# Altium footprint library PcbLib.PcbLib: 12 footprints
Each footprint in its own frame and in the unit in brackets; x right, y up, seen from the top. Pads: shape width x height; smd on the part's side, far side on the other; paste and mask are expansions set on the pad; w line width, h text height; cw(c..) or ccw(c..) is an arc to the next point about the centre after c.
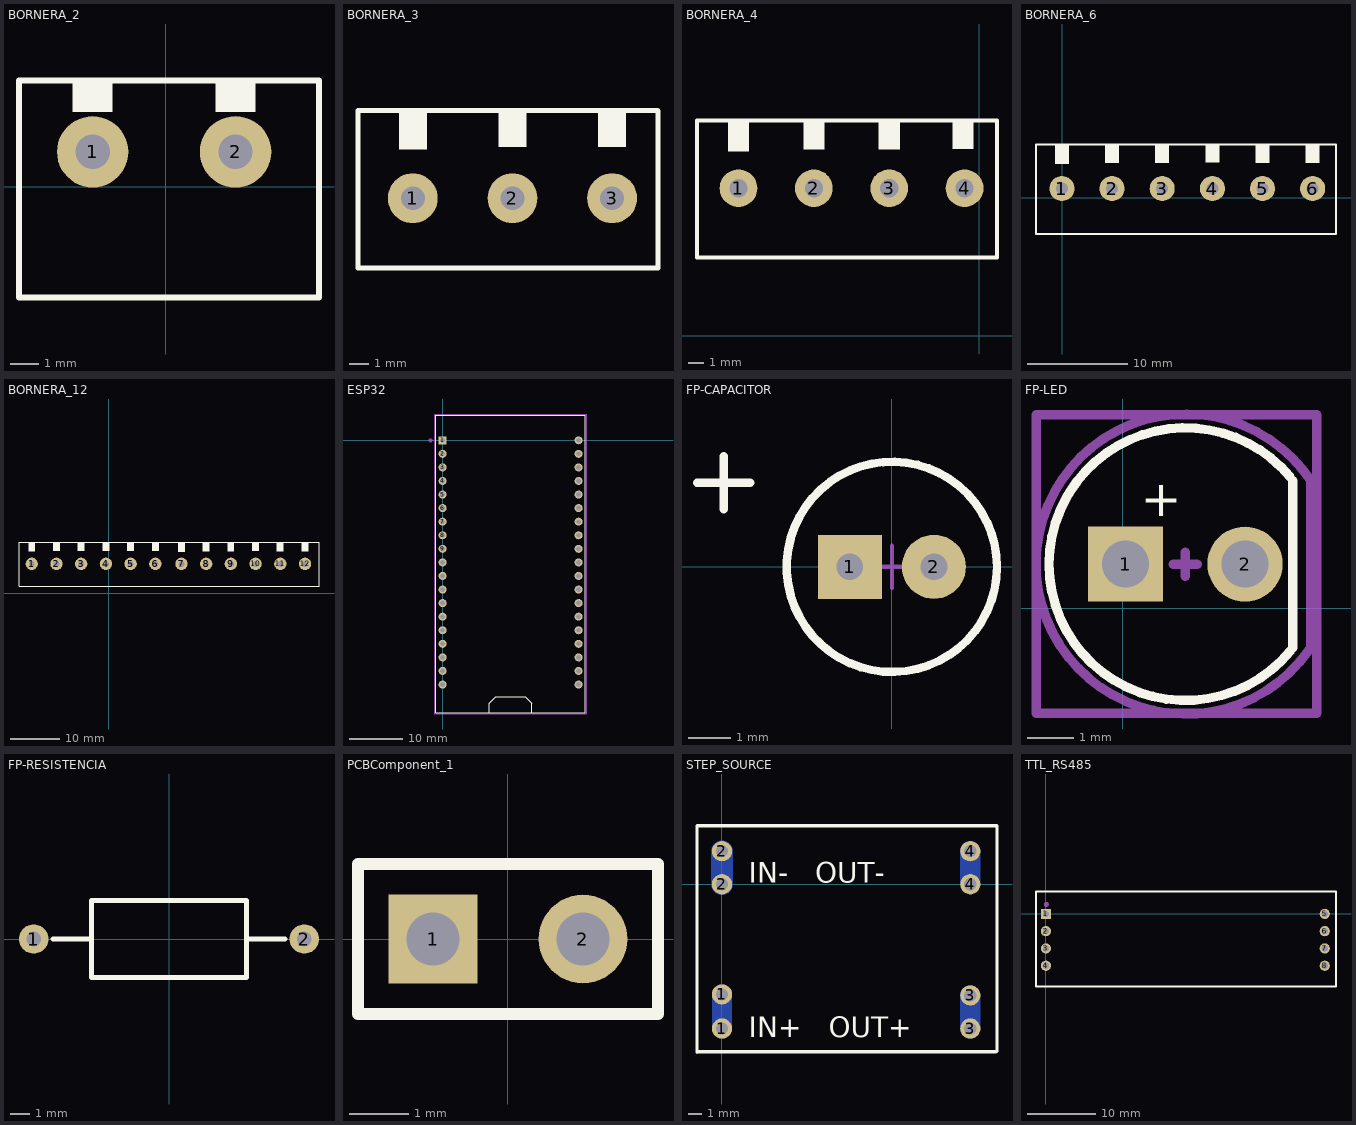
[diagram p0: the footprints below, top view; thin cyan lines are the x and y axes]

## BORNERA_2 [mm]
pads (2):
  round 2.5 hole 1.2: 1(-2.55,1.225) 2(2.45,1.225)
Top Overlay:
  rectangle: -3.25,2.625 -1.85,3.725
  rectangle: 1.75,2.625 3.15,3.725
  lines w0.2: -5.13,-3.875 -5.13,3.725 5.37,3.725 5.37,-3.875 -5.13,-3.875
3D body "User Library-bornera-1.STEP": height 10, standoff -3.75, extent -5.05,-3.795 5.45,3.805

## BORNERA_3 [mm]
pads (3):
  round 2.5 hole 1.2: 1(-15.975,9.8) 2(-10.975,9.8) 3(-5.975,9.8)
Top Overlay:
  rectangle: -16.675,12.25 -15.275,14.225
  rectangle: -6.675,12.375 -5.275,14.225
  rectangle: -11.675,12.375 -10.275,14.225
  lines w0.25: -18.725,6.3 -3.725,6.3 -3.675,6.3 -3.675,14.175 -3.7,14.2 -18.725,14.2 -18.725,6.3
3D body "bornera de 3 terminales.step": height 10, standoff -4, extent -18.65,6.25 -3.65,14.25

## BORNERA_4 [mm]
pads (4):
  round 2.5 hole 1.2: 1(-15.975,9.8) 2(-10.975,9.8) 3(-5.975,9.8) 4(-0.975,9.8)
Top Overlay:
  rectangle: -11.675,12.375 -10.275,14.225
  rectangle: -6.675,12.375 -5.275,14.225
  rectangle: -16.675,12.25 -15.275,14.225
  rectangle: -1.775,12.4 -0.375,14.25
  lines w0.25: -18.725,5.2 -18.725,14.3 1.175,14.3 1.175,5.2 -18.725,5.2
3D body "bornera de 4 terminales.step": height 12, standoff -3, extent -18.725,5.2 1.275,14.2

## BORNERA_6 [mm]
pads (6):
  round 2.5 hole 1.2: 1(-0.025,0.925) 2(4.975,0.925) 3(9.975,0.925) 4(14.975,0.925) 5(19.975,0.925) 6(24.975,0.925)
Top Overlay:
  rectangle: -0.725,3.375 0.675,5.35
  rectangle: 9.275,3.5 10.675,5.35
  rectangle: 14.275,3.525 15.675,5.35
  rectangle: 19.275,3.475 20.675,5.35
  rectangle: 24.275,3.5 25.675,5.35
  rectangle: 4.275,3.5 5.675,5.35
  lines w0.2: -2.605,-3.575 27.3,-3.575 27.3,5.325 -2.605,5.325 -2.605,-3.575
3D body "bornera de 6 terminales.STEP": height 12, standoff -3, extent -2.65,-3.625 27.35,5.375

## BORNERA_12 [mm]
pads (12):
  round 2.5 hole 1.2: 1(-15.55,6) 2(-10.55,6) 3(-5.55,6) 4(-0.55,6) 5(4.45,6) 6(9.45,6) 7(14.725,6) 8(19.725,6) 9(24.725,6) 10(29.725,6) 11(34.725,6) 12(39.725,6)
Top Overlay:
  rectangle: 14,8.4 15.4,10.375
  rectangle: 24,8.525 25.4,10.375
  rectangle: 29,8.55 30.4,10.375
  rectangle: 34,8.5 35.4,10.375
  rectangle: 39,8.525 40.4,10.375
  rectangle: 19,8.525 20.4,10.375
  rectangle: -16.25,8.45 -14.85,10.425
  rectangle: -6.25,8.575 -4.85,10.425
  rectangle: -1.25,8.6 0.15,10.425
  rectangle: 3.75,8.55 5.15,10.425
  rectangle: 8.75,8.575 10.15,10.425
  rectangle: -11.25,8.575 -9.85,10.425
  lines w0.2: -18.13,1.5 42.55,1.5 42.55,10.4 -18.13,10.4 -18.13,1.5
3D body "bornera de 12 terminales.STEP": height 12, standoff -3, extent -18.05,1.5 42.45,10.5

## ESP32 [mm]
pads (38):
  rect 1.5x1.5 hole 0.9: 1(0,0)
  round 1.5 hole 0.9: 2(0,-2.54) 3(0,-5.08) 4(0,-7.62) 5(0,-10.16) 6(0,-12.7) 7(0,-15.24) 8(0,-17.78) 9(0,-20.32) 10(0,-22.86) 11(0,-25.4) 12(0,-27.94) 13(0,-30.48) 14(0,-33.02) 15(0,-35.56) 16(0,-38.1) 17(0,-40.64) 18(0,-43.18) 19(0,-45.72) 20(25.45,-45.72) 21(25.45,-43.18) 22(25.45,-40.64) 23(25.45,-38.1) 24(25.45,-35.56) 25(25.45,-33.02) 26(25.45,-30.48) 27(25.45,-27.94) 28(25.45,-25.4) 29(25.45,-22.86) 30(25.45,-20.32) 31(25.45,-17.78) 32(25.45,-15.24) 33(25.45,-12.7) 34(25.45,-10.16) 35(25.45,-7.62) 36(25.45,-5.08) 37(25.45,-2.54) 38(25.45,0)
Top Overlay:
  lines w0.127: -1.253,-50.985 -1.253,4.685 ; -1.253,4.695 26.657,4.695 26.687,4.665 26.687,-50.985 ; -1.233,-50.985 26.667,-50.985 ; 8.717,-51.005 8.717,-49.255 9.967,-48.005 15.467,-48.005 16.717,-49.255 16.717,-51.005
Mechanical 13:
  circle w0.48: c-2.283,-0.005 r0.14
Mechanical 15:
  lines w0.05: -1.503,-51.235 -1.503,4.915 26.897,4.915 ; -1.483,-51.235 26.917,-51.235 26.917,4.915
3D body "Goouuu-ESP32 Development Board.STEP": height 8.6, standoff -4.54, extent -1.253,-50.985 26.687,4.595

## FP-CAPACITOR [mil]
pads (2):
  rect 60x60 hole 25: 1(-39.37,0)
  round 60 hole 25: 2(39.37,0)
Top Overlay:
  circle w7.87: c0,0 r98.43
  lines w7.87: -182.48,78.74 -132.48,78.74 ; -157.48,53.74 -157.48,103.74
Mechanical 13:
  circle w3.94: c0,0 r98.43
Mechanical 15:
  circle w1.97: c0,0 r98.43
  lines w3.94: -19.68,0 19.69,0 ; 0,-19.68 0,19.68
3D body "ElCapVT-2.0-5x7-black.step": height 275.63, standoff -118.11, extent -98.43,-98.41 98.46,98.41

## FP-LED [mm]
pads (2):
  rect 1.6x1.6 hole 1: 1(0.064,0.937)
  round 1.6 hole 1: 2(2.604,0.937)
Top Overlay:
  lines w0.2: -1.136,2.457 cw(c1.334,0.937) 3.562,2.794 ; -1.035,2.609 ccw(c1.334,0.937) 3.573,-0.907 ; 3.62,-0.841 3.62,2.715
  text "+" at 0.382,1.956 h0.76
Mechanical 13:
  lines w0.2: -1.841,-2.238 4.128,-2.238 4.128,4.112 -1.841,4.112 -1.841,-2.238
Mechanical 15:
  lines w0.2: 1.08,0.937 1.588,0.937 ; 1.334,0.683 1.334,1.191 ; 3.95,-0.909 cw(c1.348,0.94) 4.001,2.715 4.001,-0.841
  text "+" at 0.382,1.956 h0.76
  text ".Designator" at 1.334,0.937 h0.76
3D body "LED 5mm Green.step": height 8.72, standoff -2.98, extent -1.566,-1.963 3.834,3.837

## FP-RESISTENCIA [mil]
pads (2):
  round 60 hole 30: 1(-275.59,0) 2(275.59,0)
Top Overlay:
  lines w10: -236.22,0 -157.48,0 ; 157.48,0 236.22,0 ; -157.48,-78.74 157.48,-78.74 157.48,78.74 -157.48,78.74 -157.48,-78.74
3D body "RES-1W.STEP": height 183.17, standoff -92.42, extent -291.34,-78.74 291.34,78.74

## PCBComponent_1 [mm]
pads (2):
  rect 1.5x1.5 hole 0.9: 1(-1.27,0)
  round 1.5 hole 0.9: 2(1.27,0)
Top Overlay:
  lines w0.2: -2.54,-1.27 -2.54,1.27 2.54,1.27 2.54,-1.27 -2.54,-1.27
3D body "2-Pin Header - Male - 2.54mm.step": height 8.89, standoff -3.05, extent -2.54,-1.27 2.54,1.27

## STEP_SOURCE [mm]
pads (8):
  round 1.5 hole 0.9: 1(0,-10.675) 1(0,-8.15) 2(0,0) 2(0,2.45) 3(18.375,-10.675) 3(18.375,-8.225) 4(18.375,0) 4(18.375,2.45)
Bottom Layer:
  lines w1.5: 0,-10.675 0,-8.15 ; 18.375,-10.675 18.375,-8.225 ; 18.375,0.35 18.375,2.45
  lines w1.6: 0,0 0,2.45
Top Overlay:
  lines w0.25: -1.85,-12.425 -1.85,4.325 20.325,4.325 20.35,4.3 20.35,-12.325 20.275,-12.4 -1.825,-12.4 -1.85,-12.425
  text "IN-   OUT- /  /  /  /  / IN+   OUT+" at 1.975,-11.325 h1.52
3D body "D-SUN dc-dc step down converter.step": height 4.19, standoff 0, extent -1.841,-12.472 20.259,4.328

## TTL_RS485 [mm]
pads (8):
  rect 1.5x1.5 hole 0.9: 1(0,0)
  round 1.5 hole 0.9: 2(0,-2.54) 3(0,-5.08) 4(0,-7.62) 5(40.961,0) 6(40.961,-2.54) 7(40.961,-5.08) 8(40.961,-7.62)
Top Overlay:
  lines w0.254: -1.459,-10.678 -1.459,3.292 42.61,3.292 42.61,-10.678 -1.459,-10.678
Mechanical 13:
  circle w0.48: c0.065,1.387 r0.14
3D body "User Library-TTL_RS485.STEP": height 13.79, standoff -6.21, extent -1.459,-10.693 42.541,3.307